# Altium footprint library Conectores GAM.PcbLib: 182 footprints (part 1 of 12)
Each footprint in its own frame and in the unit in brackets; x right, y up, seen from the top. Pads: shape width x height; smd on the part's side, far side on the other; paste and mask are expansions set on the pad; w line width, h text height; cw(c..) or ccw(c..) is an arc to the next point about the centre after c.
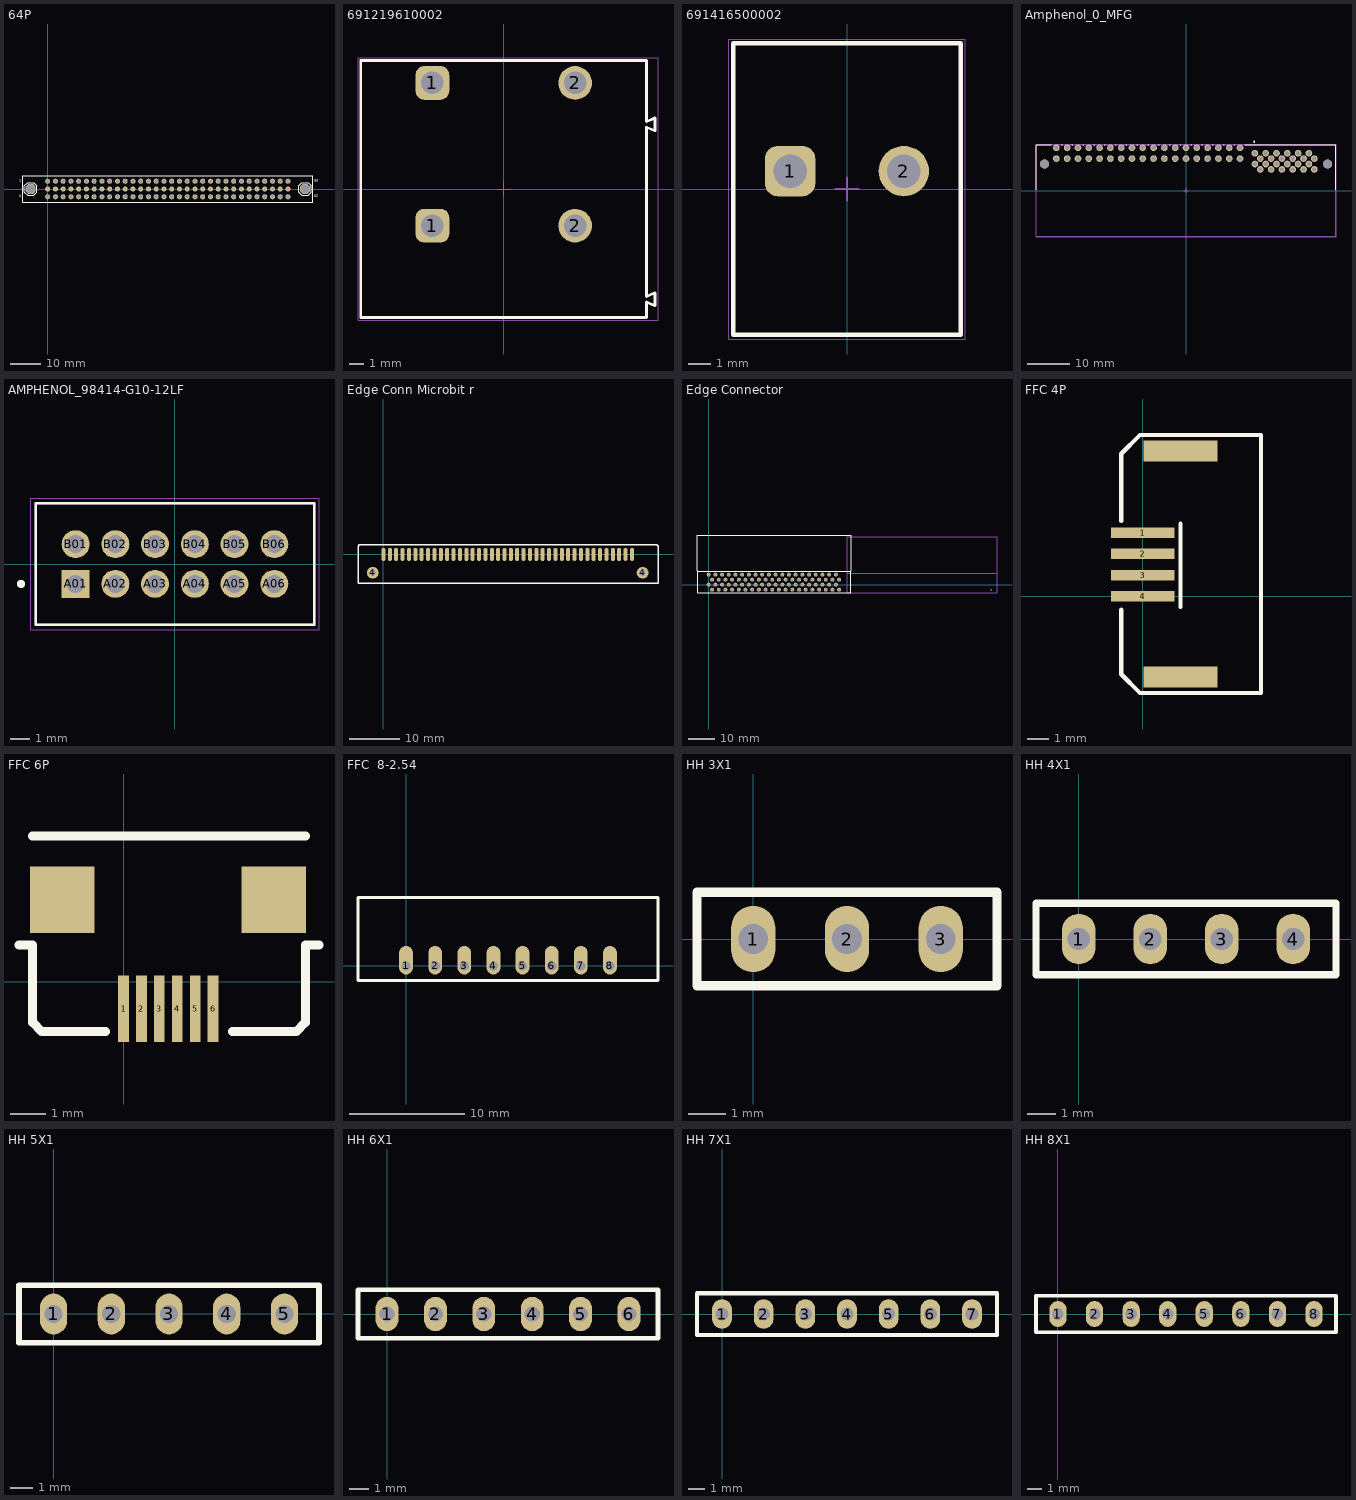
[diagram p0: the footprints below, top view; thin cyan lines are the x and y axes]

## 64P [mm] "Connector 64P PMQ"
pads (98):
  round 1.65 hole 1.1: 0(0,-2.54) 1(0,2.54) 2(2.54,-2.54) 3(2.54,2.54) 4(5.08,-2.54) 5(5.08,2.54) 6(7.62,-2.54) 7(7.62,2.54) 8(10.16,-2.54) 9(10.16,2.54) 10(12.7,-2.54) 11(12.7,2.54) 12(15.24,-2.54) 13(15.24,2.54) 14(17.78,-2.54) 15(17.78,2.54) 16(20.32,-2.54) 17(20.32,2.54) 18(22.86,-2.54) 19(22.86,2.54) 20(25.4,-2.54) 21(25.4,2.54) 22(27.94,-2.54) 23(27.94,2.54) 24(30.48,-2.54) 25(30.48,2.54) 26(33.02,-2.54) 27(33.02,2.54) 28(35.56,-2.54) 29(35.56,2.54) 30(38.1,-2.54) 31(38.1,2.54) 32(40.64,-2.54) 33(40.64,2.54) 34(43.18,-2.54) 35(43.18,2.54) 36(45.72,-2.54) 37(45.72,2.54) 38(48.26,-2.54) 39(48.26,2.54) 40(50.8,-2.54) 41(50.8,2.54) 42(53.34,-2.54) 43(53.34,2.54) 44(55.88,-2.54) 45(55.88,2.54) 46(58.42,-2.54) 47(58.42,2.54) 48(60.96,-2.54) 49(60.96,2.54) 50(63.5,-2.54) 51(63.5,2.54) 52(66.04,-2.54) 53(66.04,2.54) 54(68.58,-2.54) 55(68.58,2.54) 56(71.12,-2.54) 57(71.12,2.54) 58(73.66,-2.54) 59(73.66,2.54) 60(76.2,-2.54) 61(76.2,2.54) 62(78.74,-2.54) 63(78.74,2.54)
  oct 3.3x3.3 hole 3: ""(-5.588,0) ""(84.328,0)
  round 1.65 hole 0.5: ""(0,0) ""(2.54,0) ""(5.08,0) ""(7.62,0) ""(10.16,0) ""(12.7,0) ""(15.24,0) ""(17.78,0) ""(20.32,0) ""(22.86,0) ""(25.4,0) ""(27.94,0) ""(30.48,0) ""(33.02,0) ""(35.56,0) ""(38.1,0) ""(40.64,0) ""(43.18,0) ""(45.72,0) ""(48.26,0) ""(50.8,0) ""(53.34,0) ""(55.88,0) ""(58.42,0) ""(60.96,0) ""(63.5,0) ""(66.04,0) ""(68.58,0) ""(71.12,0) ""(73.66,0) ""(76.2,0) ""(78.74,0)
Top Overlay:
  lines w0.254: -8.135,-4.35 86.865,-4.35 86.865,4.35 -8.135,4.35 -8.135,-4.35 ; -7.62,-1.016 -7.62,1.016 -6.604,2.032 -4.572,2.032 -3.556,1.016 -3.556,-1.016 -4.572,-2.032 -6.604,-2.032 -7.62,-1.016 ; 82.296,-1.016 83.312,-2.032 85.344,-2.032 86.36,-1.016 86.36,1.016 85.344,2.032 83.312,2.032 82.296,1.016 82.296,-1.016
  text "63" at 87.376,2.032 h1.52
  text "62" at 87.376,-3.048 h1.52
  text "1" at -9.398,2.032 h1.52
  text "0" at -9.398,-3.048 h1.52
3D body "PMQ64.step": height 12, standoff -2.81, extent -8.065,-5.5 86.805,5.5

## 691219610002 [mm] "Serie 2196 - 10.16 mm Horizontal Entry Modular WR-TBL, 2 pin"
height 28.5
pads (4):
  rrect50% 2.4x2.4 hole 1.6: 1(-5.08,-2.61) 1(-5.08,7.55)
  round 2.4 hole 1.6: 2(5.08,-2.61) 2(5.08,7.55)
Top Overlay:
  lines w0.2: 10.76,-8.301 10.16,-8.05 10.16,-9.15 -10.18,-9.15 -10.18,9.15 10.16,9.15 10.16,4.8 10.76,5.051 ; 10.76,-8.3 10.76,-7.4 10.16,-7.651 10.16,4.4 10.76,4.149 ; 10.76,4.15 10.76,5.05
Mechanical 11:
  lines w0.1: 10.76,-8.301 10.16,-8.05 10.16,-9.15 -10.18,-9.15 -10.18,9.15 10.16,9.15 10.16,4.8 10.76,5.051 ; 10.76,-8.3 10.76,-7.4 10.16,-7.651 10.16,4.4 10.76,4.149 ; 10.76,4.15 10.76,5.05
Mechanical 13:
  lines w0.1: 10.76,-8.301 10.16,-8.05 10.16,-9.15 -10.18,-9.15 -10.18,9.15 10.16,9.15 10.16,4.8 10.76,5.051 ; 10.76,-8.3 10.76,-7.4 10.16,-7.651 10.16,4.4 10.76,4.149 ; 10.76,4.15 10.76,5.05
Mechanical 15:
  lines w0.05: -0.5,0 0.5,0 ; 0,-0.5 0,0.5 ; -10.38,-9.35 -10.38,9.35 10.98,9.35 10.98,-9.35 -10.38,-9.35
3D body "691219610002.stp": height 28.6, standoff -4.5, extent -10.18,-9.15 10.74,9.15

## 691416500002 [mm] "5.08 mm Screwless Vertical Entry, 2p"
height 12.5
pads (2):
  rrect50% 2.25x2.25 hole 1.5: 1(-2.54,0.8)
  round 2.25 hole 1.5: 2(2.54,0.8)
Top Overlay:
  lines w0.2: -5.08,-6.5 5.08,-6.5 5.08,6.5 -5.08,6.5 -5.08,-6.5
Top 3D Body:
  lines w0.1: -5.08,-6.5 5.08,-6.5 5.08,6.5 -5.08,6.5 -5.08,-6.5
Top Courtyard:
  lines w0.05: -5.28,-6.7 5.28,-6.7 5.28,6.7 -5.28,6.7 -5.28,-6.7
Top Assembly:
  lines w0.1: -5.08,-6.5 -5.08,6.5 5.08,6.5 5.08,-6.5 -5.08,-6.5
Top Component Center:
  lines w0.1: -0.5,0 0.5,0 ; 0,-0.5 0,0.5
3D body "691416500002.stp": height 12.55, standoff -4.95, extent -5.08,-6.5 5.08,6.5

## Amphenol_0_MFG [mm]
pads (62):
  round 1.57 hole 1.02 paste-1000 mask+0: P1(-30.48,7.52) P2(-27.94,7.52) P3(-25.4,7.52) P4(-22.86,7.52) P5(-20.32,7.52) P6(-17.78,7.52) P7(-15.24,7.52) P8(-12.7,7.52) P9(-10.16,7.52) P10(-7.62,7.52) P11(-5.08,7.52) P12(-2.54,7.52) P13(0,7.52) P14(2.54,7.52) P15(5.08,7.52) P16(7.62,7.52) P17(10.16,7.52) P18(12.7,7.52) P19(12.7,10.06) P20(10.16,10.06) P21(7.62,10.06) P22(5.08,10.06) P23(2.54,10.06) P24(0,10.06) P25(-2.54,10.06) P26(-5.08,10.06) P27(-7.62,10.06) P28(-10.16,10.06) P29(-12.7,10.06) P30(-15.24,10.06) P31(-17.78,10.06) P32(-20.32,10.06) P33(-22.86,10.06) P34(-25.4,10.06) P35(-27.94,10.06) P36(-30.48,10.06) S1(16.2,6.25) S2(17.47,4.98) S3(18.74,6.25) S4(20.01,4.98) S5(21.28,6.25) S6(22.55,4.98) S7(23.82,6.25) S8(25.09,4.98) S9(26.36,6.25) S10(27.63,4.98) S11(28.9,6.25) S12(30.17,4.98) S13(30.17,7.52) S14(28.9,8.79) S15(27.63,7.52) S16(26.36,8.79) S17(25.09,7.52) S18(23.82,8.79) S19(22.55,7.52) S20(21.28,8.79) S21(20.01,7.52) S22(18.74,8.79) S23(17.47,7.52) S24(16.2,8.79)
  round 2.1 hole 2.1 unplated paste-1000 mask+0: ""(-33.27,6.25) ""(33.3,6.25)
Top Overlay:
  circle w0.25: c16.075,11.475 r0.125
  lines w0.2: -35.165,10.745 -31.67,10.745 ; -35.162,0.191 -35.162,10.691 ; -29.35,10.745 -29.13,10.745 ; -26.81,10.745 -26.59,10.745 ; -24.27,10.745 -24.05,10.745 ; -21.73,10.745 -21.51,10.745 ; -19.19,10.745 -18.97,10.745 ; -16.65,10.745 -16.43,10.745 ; -14.11,10.745 -13.89,10.745 ; -11.57,10.745 -11.35,10.745 ; -9.03,10.745 -8.81,10.745 ; -6.49,10.745 -6.27,10.745 ; -3.95,10.745 -3.73,10.745 ; -1.41,10.745 -1.19,10.745 ; 1.13,10.745 1.35,10.745 ; 3.67,10.745 3.89,10.745 ; 6.21,10.745 6.43,10.745 ; 8.75,10.745 8.97,10.745 ; 11.29,10.745 11.51,10.745 ; 13.83,10.745 35.165,10.745 ; 35.165,0.2 35.165,10.7
Mechanical 10:
  lines w0.2: -35.265,-10.845 -35.265,10.945 35.265,10.945 35.265,-10.845 -35.265,-10.845
  text ".Designator" at 0,0.049 h1
Mechanical 12:
  lines w0.2: -35.165,-10.745 -35.165,10.745 35.165,10.745 35.165,-10.745 -35.165,-10.745
Mechanical 15:
  lines w0.1: -0.5,0 0.5,0 ; 0,-0.5 0,0.5
  lines w0.2: -35.265,-10.845 -35.265,10.945 35.265,10.945 35.265,-10.845 -35.265,-10.845
3D body "Conn_Amphenol_10130248-005LF_eec.STEP": height 0.25, standoff 0, extent -35.265,-10.845 35.265,10.945

## AMPHENOL_98414-G10-12LF [mm]
height 5.9
pads (12):
  rect 1.408x1.408 / inner round 1.408 / far side rect 1.408x1.408 hole 0.9: A01(-5,-1)
  round 1.408 hole 0.9: A02(-3,-1) A03(-1,-1) A04(1,-1) A05(3,-1) A06(5,-1) B01(-5,1) B02(-3,1) B03(-1,1) B04(1,1) B05(3,1) B06(5,1)
Top Overlay:
  circle w0.2: c-7.75,-1 r0.1
  lines w0.127: -7,-3.05 7,-3.05 7,3.05 -7,3.05 -7,-3.05
Mechanical 13:
  circle w0.2: c-7.75,-1 r0.1
  lines w0.127: -7,-3.05 7,-3.05 7,3.05 -7,3.05 -7,-3.05
Mechanical 15:
  lines w0.05: -7.25,-3.3 7.25,-3.3 7.25,3.3 -7.25,3.3 -7.25,-3.3
3D body "step_temp.STEP": height 5.9, standoff -3.7, extent -7,-3.05 7,3.05

## Edge Conn Microbit r [mm]
pads (42):
  oct 0.8x2.65 smd: 1(49.53,0) 2(44.45,0) 2(45.72,0) 2(46.99,0) 2(48.26,0) 3(43.18,0) 4(41.91,0) 5(40.64,0) 6(39.37,0) 7(34.29,0) 7(35.56,0) 7(36.83,0) 7(38.1,0) 8(33.02,0) 9(31.75,0) 10(30.48,0) 11(29.21,0) 12(27.94,0) 13(22.86,0) 13(24.13,0) 13(25.4,0) 13(26.67,0) 14(21.59,0) 15(20.32,0) 16(19.05,0) 17(17.78,0) 18(10.16,0) 18(11.43,0) 18(12.7,0) 18(13.97,0) 18(15.24,0) 18(16.51,0) 19(8.89,0) 20(7.62,0) 21(0,0) 21(1.27,0) 21(2.54,0) 21(3.81,0) 21(5.08,0) 21(6.35,0)
  round 2.35 hole 1.15: 4(-2.135,-3.65) 4(51.665,-3.65)
Top Overlay:
  lines w0.254: -5.08,-5.715 -5.08,1.651 -4.826,1.905 54.483,1.905 54.737,1.651 54.737,-5.715 -5.08,-5.715
3D body "Microbit board assembly.stp": height 47.03, standoff 4.28, extent -1.235,-7.445 50.765,3.155
3D body: height 10.6, standoff 0, extent -4.445,-5.08 53.975,-3.429
3D body: height 10.6, standoff 0, extent -4.445,-1.651 53.975,0
3D body: height 10.6, standoff 0, extent -4.445,-5.08 -1.905,0
3D body: height 10.6, standoff 0, extent 51.435,-5.08 53.975,0
3D body: height 0.25, standoff 0, extent -0.317,-0.635 0.318,1.143
3D body: height 0.25, standoff 0, extent 0.953,-0.635 1.588,1.143
3D body: height 0.25, standoff 0, extent 2.223,-0.635 2.858,1.143
3D body: height 0.25, standoff 0, extent 6.033,-0.635 6.668,1.143
3D body: height 0.25, standoff 0, extent 4.763,-0.635 5.398,1.143
3D body: height 0.25, standoff 0, extent 3.493,-0.635 4.128,1.143
3D body: height 0.25, standoff 0, extent 11.113,-0.635 11.748,1.143
3D body: height 0.25, standoff 0, extent 12.383,-0.635 13.018,1.143
3D body: height 0.25, standoff 0, extent 13.653,-0.635 14.288,1.143
3D body: height 0.25, standoff 0, extent 9.843,-0.635 10.478,1.143
3D body: height 0.25, standoff 0, extent 8.573,-0.635 9.208,1.143
3D body: height 0.25, standoff 0, extent 7.303,-0.635 7.938,1.143
3D body: height 0.25, standoff 0, extent 18.733,-0.635 19.368,1.143
3D body: height 0.25, standoff 0, extent 20.003,-0.635 20.638,1.143
3D body: height 0.25, standoff 0, extent 21.273,-0.635 21.908,1.143
3D body: height 0.25, standoff 0, extent 17.463,-0.635 18.098,1.143
3D body: height 0.25, standoff 0, extent 16.193,-0.635 16.828,1.143
3D body: height 0.25, standoff 0, extent 14.923,-0.635 15.558,1.143
3D body: height 0.25, standoff 0, extent 37.783,-0.635 38.418,1.143
3D body: height 0.25, standoff 0, extent 39.053,-0.635 39.688,1.143
3D body: height 0.25, standoff 0, extent 40.323,-0.635 40.958,1.143
3D body: height 0.25, standoff 0, extent 44.133,-0.635 44.768,1.143
3D body: height 0.25, standoff 0, extent 42.863,-0.635 43.498,1.143
3D body: height 0.25, standoff 0, extent 41.593,-0.635 42.228,1.143
3D body: height 0.25, standoff 0, extent 30.163,-0.635 30.798,1.143
3D body: height 0.25, standoff 0, extent 31.433,-0.635 32.068,1.143
3D body: height 0.25, standoff 0, extent 32.703,-0.635 33.338,1.143
3D body: height 0.25, standoff 0, extent 36.513,-0.635 37.148,1.143
3D body: height 0.25, standoff 0, extent 35.243,-0.635 35.878,1.143
3D body: height 0.25, standoff 0, extent 33.973,-0.635 34.608,1.143
3D body: height 0.25, standoff 0, extent 26.353,-0.635 26.988,1.143
3D body: height 0.25, standoff 0, extent 27.623,-0.635 28.258,1.143
3D body: height 0.25, standoff 0, extent 28.893,-0.635 29.528,1.143
3D body: height 0.25, standoff 0, extent 25.083,-0.635 25.718,1.143
3D body: height 0.25, standoff 0, extent 23.813,-0.635 24.448,1.143
3D body: height 0.25, standoff 0, extent 22.543,-0.635 23.178,1.143
3D body: height 0.25, standoff 0, extent 47.943,-0.635 48.578,1.143
3D body: height 0.25, standoff 0, extent 49.213,-0.635 49.848,1.143
3D body: height 0.25, standoff 0, extent 46.673,-0.635 47.308,1.143
3D body: height 0.25, standoff 0, extent 45.403,-0.635 46.038,1.143

## Edge Connector [mm] "80P 1.27mm Edge Connector MicroBit"
pads (80):
  round 1.508 / inner round 1.524 / far side round 1.508 hole 1: A1(49.53,-1.9) A2(48.26,0) A3(46.99,-1.9) A4(45.72,0) A5(44.45,-1.9) A6(43.18,0) A7(41.91,-1.9) A8(40.64,0) A9(39.37,-1.9) A10(38.1,0) A11(36.83,-1.9) A12(35.56,0) A13(34.29,-1.9) A14(33.02,0) A15(31.75,-1.9) A16(30.48,0) A17(29.21,-1.9) A18(27.94,0) A19(26.67,-1.9) A20(25.4,0) A21(24.13,-1.9) A22(22.86,0) A23(21.59,-1.9) A24(20.32,0) A25(19.05,-1.9) A26(17.78,0) A27(16.51,-1.9) A28(15.24,0) A29(13.97,-1.9) A30(12.7,0) A31(11.43,-1.9) A32(10.16,0) A33(8.89,-1.9) A34(7.62,0) A35(6.35,-1.9) A36(5.08,0) A37(3.81,-1.9) A38(2.54,0) A39(1.27,-1.9) A40(0,0) B1(49.53,1.9) B2(48.26,3.8) B3(46.99,1.9) B4(45.72,3.8) B5(44.45,1.9) B6(43.18,3.8) B7(41.91,1.9) B8(40.64,3.8) B9(39.37,1.9) B10(38.1,3.8) B11(36.83,1.9) B12(35.56,3.8) B13(34.29,1.9) B14(33.02,3.8) B15(31.75,1.9) B16(30.48,3.8) B17(29.21,1.9) B18(27.94,3.8) B19(26.67,1.9) B20(25.4,3.8) B21(24.13,1.9) B22(22.86,3.8) B23(21.59,1.9) B24(20.32,3.8) B25(19.05,1.9) B26(17.78,3.8) B27(16.51,1.9) B28(15.24,3.8) B29(13.97,1.9) B30(12.7,3.8) B31(11.43,1.9) B32(10.16,3.8) B33(8.89,1.9) B34(7.62,3.8) B35(6.35,1.9) B36(5.08,3.8) B37(3.81,1.9) B38(2.54,3.8) B39(1.27,1.9) B40(0,3.8)
Top Overlay:
  lines w0.254: -4.191,5.08 -4.445,5.334 -4.445,18.796 54.102,18.796 54.102,5.334 53.848,5.08 ; -4.191,5.08 -4.191,-3.048 53.848,-3.048 53.848,5.08 ; -4.191,5.08 53.848,5.08
Mechanical 8:
  lines w0.152: 52.576,4.283 52.576,18.283 109.476,18.283 109.476,4.283 ; 52.576,4.283 52.576,-3.087 109.476,-3.087 109.476,4.283 ; 52.576,4.283 109.476,4.283
Mechanical 22:
  circle w0.381: c107.315,-2.017 r0.152
  lines w0.203: 52.576,4.383 52.576,-3.087 109.476,-3.087 109.476,4.383
Mechanical 23:
  circle w0.381: c107.315,-2.017 r0.152
3D body "microbit edge connector PHT v1.step": height 10.2, standoff -2.07, extent -4.075,-2.675 53.825,18.769
3D body "Microbit board assembly.stp": height 10.02, standoff -0.58, extent -1.235,10.091 50.765,52.841

## FFC 4P [mm] "Conector FFC 4P 1mm"
pads (6):
  rect 3x0.5 smd: 1(0,3) 2(0,2) 3(0,1) 4(0,0)
  rect 3.5x1 smd: ""(1.778,-3.81) ""(1.778,6.858)
Top Overlay:
  lines w0.2: -1.016,-0.635 -1.016,-3.683 -0.127,-4.572 1.27,-4.572 5.588,-4.572 5.588,7.62 1.27,7.62 -0.127,7.62 -1.016,6.731 -1.016,3.556 ; 1.778,-0.508 1.778,3.429
3D body "FFC 4X1 1mm.stp": height 2.56, standoff -0.02, extent -1.065,-4.436 5.485,7.484

## FFC 6P [mm] "Conector FFC 6P 0.5mm"
pads (8):
  rect 0.3x1.85 smd: 1(0,-0.762) 2(0.5,-0.762) 3(1,-0.762) 4(1.5,-0.762) 5(2,-0.762) 6(2.5,-0.762)
  rect 1.8x1.85 smd: ""(-1.708,2.286) ""(4.191,2.286)
Top Overlay:
  lines w0.254: -2.921,1.016 -2.54,1.016 -2.54,-1.143 -2.286,-1.397 -0.508,-1.397 ; -2.54,4.064 5.08,4.064 ; 3.048,-1.397 4.826,-1.397 5.08,-1.143 5.08,1.016 5.461,1.016
3D body "FFC6P0.5mm.STEP": height 2.11, standoff 0.01, extent -2.28,-1.27 4.82,5.13

## FFC  8-2.54 [mm] "Conector FFC Angulo 2.54mm 8P"
pads (8):
  oval 1.2x2.5 hole 0.8 copper offset 0,0.5: 1(0,0) 2(2.54,0) 3(5.08,0) 4(7.62,0) 5(10.16,0) 6(12.7,0) 7(15.24,0) 8(17.78,0)
Top Overlay:
  lines w0.254: -4.191,-1.27 -4.191,5.969 21.971,5.969 21.971,-1.27 -4.191,-1.27
3D body "ffc8254.stp": height 5, standoff -2.49, extent -4,-0.731 21.78,5.969

## HH 3X1 [mm] "Header Hembra 3x1 2.54mm"
pads (3):
  oval 1.2x1.8 hole 0.8: 1(0,0) 2(2.54,0) 3(5.08,0)
Top Overlay:
  lines w0.254: -1.524,-1.27 6.604,-1.27 6.604,1.27 -1.524,1.27 -1.524,-1.27
3D body "HH3X1.stp": height 9, standoff -2.7, extent -1.397,-1.25 6.473,1.25

## HH 4X1 [mm] "Header Hembra 4x1 2.54mm"
pads (4):
  oval 1.2x1.8 hole 0.8: 1(0,0) 2(2.54,0) 3(5.08,0) 4(7.62,0)
Top Overlay:
  lines w0.254: -1.524,-1.27 -1.524,1.27 9.144,1.27 9.144,-1.27 -1.524,-1.27
3D body "HH4X1.stp": height 9, standoff -2.7, extent -1.397,-1.25 9.013,1.25

## HH 5X1 [mm] "Header Hembra 5x1 2.54mm"
pads (5):
  oval 1.2x1.8 hole 0.8: 1(0,0) 2(2.54,0) 3(5.08,0) 4(7.62,0) 5(10.16,0)
Top Overlay:
  lines w0.254: -1.524,-1.27 -1.524,1.27 11.684,1.27 11.684,-1.27 -1.524,-1.27
3D body "HH5X1.stp": height 9, standoff -2.7, extent -1.397,-1.25 11.553,1.25

## HH 6X1 [mm] "Header Hembra 6x1 2.54mm"
pads (6):
  oval 1.2x1.8 hole 0.8: 1(0,0) 2(2.54,0) 3(5.08,0) 4(7.62,0) 5(10.16,0) 6(12.7,0)
Top Overlay:
  lines w0.254: -1.524,-1.27 14.224,-1.27 14.224,1.27 -1.524,1.27 -1.524,-1.27
3D body "HH6X1.stp": height 9, standoff -2.7, extent -1.397,-1.25 14.093,1.25

## HH 7X1 [mm] "Header Hembra 7x1 2.54mm"
pads (7):
  oval 1.2x1.8 hole 0.8: 1(0,0) 2(2.54,0) 3(5.08,0) 4(7.62,0) 5(10.16,0) 6(12.7,0) 7(15.24,0)
Top Overlay:
  lines w0.254: -1.524,-1.27 16.764,-1.27 16.764,1.27 -1.524,1.27 -1.524,-1.27
3D body "HH7X1.stp": height 9, standoff -2.7, extent -1.397,-1.25 16.633,1.25

## HH 8X1 [mm] "Header Hembra 8x1 2.54mm"
pads (8):
  oval 1.2x1.8 hole 0.8: 1(0,0) 2(2.54,0) 3(5.08,0) 4(7.62,0) 5(10.16,0) 6(12.7,0) 7(15.24,0) 8(17.78,0)
Top Overlay:
  lines w0.254: -1.524,-1.27 19.304,-1.27 19.304,1.27 -1.524,1.27 -1.524,-1.27
3D body "HH8X1.stp": height 9, standoff -2.7, extent -1.397,-1.25 19.173,1.25